# Altium footprint library 7-Connectors-11.PcbLib: 59 footprints (part 1 of 4) (continued)
## HFBR-2602Z [mm] "HFBR-2602Z Series, Fiber Optic Receiver, Through Hole Mount" (continued)
3D body "HFBR-2602Z.stp": height 10.2, standoff -3.6, extent -5.08,-6.348 17.62,6.348

## HFBR-X40X [mm] "HFBR-0400Z Series, Fiber Optic Transmitter or Receiver, Through Hole Mount"
height 10.2
pads (8):
  round 1.7 hole 1: 1(-1.27,3.81) 4(-1.27,-3.81) 5(1.27,-3.81) 8(1.27,3.81)
  round 1.4 hole 0.7: 2(-1.27,1.27) 3(-1.27,-1.27) 6(1.27,-1.27) 7(1.27,1.27)
Top Overlay:
  circle w0.3: c-3.81,5.08 r0.15
  lines w0.2: 7.62,-3.2 8.12,-3.2 8.12,3.2 7.62,3.2 ; 8.12,2.7 8.62,3.2 ; 8.62,-3.2 9.12,2.7 ; 8.62,-3.2 8.12,-2.7 8.62,3.2 ; 8.62,-3.2 9.12,-2.7 ; 8.62,3.2 9.12,2.7 ; 9.12,-2.7 9.62,3.2 ; 9.12,-2.7 9.62,-3.2 ; 9.12,2.7 9.62,3.2 ; 9.62,-3.2 10.12,2.7 ; 9.62,-3.2 10.12,-2.7 ; 9.62,3.2 10.12,2.7 ; 10.12,-2.7 10.62,3.2 ; 10.12,-2.7 10.62,-3.2 ; 10.12,2.7 10.62,3.2 ; 10.62,-3.2 11.12,2.7 ; 10.62,-3.2 11.12,-2.7 ; 10.62,3.2 11.12,2.7 ; 11.12,-2.7 11.62,3.2 ; 11.12,-2.7 11.62,-3.2 ; 11.12,2.7 11.62,3.2 ; 11.62,-3.2 12.12,2.7 ; 11.62,-3.2 12.12,-2.7 ; 11.62,3.2 12.12,2.7 ; 12.12,-2.7 12.62,3.2 ; 12.12,-2.7 12.62,-3.2 ; 12.12,2.7 12.62,3.2 ; 12.62,-3.2 13.12,2.7 ; 12.62,-3.2 13.12,-2.7 ; 12.62,3.2 13.12,2.7 ; 13.12,-2.7 13.62,3.2 ; 13.12,-2.7 13.62,-3.2 ; 13.12,2.7 13.62,3.2 ; 13.62,-3.2 14.12,2.7 ; 13.62,-3.2 14.12,-2.7 ; 13.62,3.2 14.12,2.7 ; 14.12,-2.7 14.62,3.2 ; 14.12,-2.7 14.62,-3.2 ; 14.12,2.7 14.62,3.2 ; 14.62,-3.2 15.12,2.7 ; 14.62,-3.2 15.12,-2.7 ; 14.62,3.2 15.12,2.7 ; 15.12,-2.7 15.62,3.2 ; 15.12,-2.7 15.62,-3.2 ; 15.12,2.7 15.62,3.2 ; 15.62,-3.2 16.12,2.7 ; 15.62,-3.2 16.12,-2.7 ; 15.62,3.2 16.12,2.7 ; 16.12,-2.7 16.62,3.2 ; 16.12,-2.7 16.62,-3.2 ; 16.12,2.7 16.62,3.2 ; 16.62,-3.2 17.12,2.7 ; 16.62,-3.2 17.12,-2.7 17.12,2.7 ; 16.62,3.2 17.12,2.7 ; -5.08,-6.15 ccw(c-4.88,-6.15) -4.88,-6.35 7.42,-6.35 ccw(c7.42,-6.15) 7.62,-6.15 7.62,6.15 ccw(c7.42,6.15) 7.42,6.35 -4.88,6.35 ccw(c-4.88,6.15) -5.08,6.15 -5.08,-6.15
Mechanical 8:
  lines w0.1: -2.27,-3.81 -1.27,-3.81 ; -2.27,-1.27 -1.27,-1.27 ; -2.27,1.27 -1.27,1.27 ; -2.27,3.81 -1.27,3.81 ; -1.27,-4.81 -1.27,-3.81 ; -1.27,-2.81 -1.27,-3.81 ; -1.27,-2.27 -1.27,-1.27 ; -1.27,-0.27 -1.27,-1.27 ; -1.27,0.27 -1.27,1.27 ; -1.27,2.27 -1.27,1.27 ; -1.27,2.81 -1.27,3.81 ; -1.27,4.81 -1.27,3.81 ; -1,0 0,0 ; -0.27,-3.81 -1.27,-3.81 ; -0.27,-1.27 -1.27,-1.27 ; -0.27,1.27 -1.27,1.27 ; -0.27,3.81 -1.27,3.81 ; 0,-1 0,0 ; 0,1 0,0 ; 0.27,-3.81 1.27,-3.81 ; 0.27,-1.27 1.27,-1.27 ; 0.27,1.27 1.27,1.27 ; 0.27,3.81 1.27,3.81 ; 1,0 0,0 ; 1.27,-4.81 1.27,-3.81 ; 1.27,-2.81 1.27,-3.81 ; 1.27,-2.27 1.27,-1.27 ; 1.27,-0.27 1.27,-1.27 ; 1.27,0.27 1.27,1.27 ; 1.27,2.27 1.27,1.27 ; 1.27,2.81 1.27,3.81 ; 1.27,4.81 1.27,3.81 ; 2.27,-3.81 1.27,-3.81 ; 2.27,-1.27 1.27,-1.27 ; 2.27,1.27 1.27,1.27 ; 2.27,3.81 1.27,3.81
Mechanical 14:
  circle w0.3: c-3.81,5.08 r0.15
  lines w0.1: 7.62,-3.2 8.12,-3.2 8.12,3.2 7.62,3.2 ; 8.12,2.7 8.62,3.2 ; 8.62,-3.2 9.12,2.7 ; 8.62,-3.2 8.12,-2.7 8.62,3.2 ; 8.62,-3.2 9.12,-2.7 ; 8.62,3.2 9.12,2.7 ; 9.12,-2.7 9.62,3.2 ; 9.12,-2.7 9.62,-3.2 ; 9.12,2.7 9.62,3.2 ; 9.62,-3.2 10.12,2.7 ; 9.62,-3.2 10.12,-2.7 ; 9.62,3.2 10.12,2.7 ; 10.12,-2.7 10.62,3.2 ; 10.12,-2.7 10.62,-3.2 ; 10.12,2.7 10.62,3.2 ; 10.62,-3.2 11.12,2.7 ; 10.62,-3.2 11.12,-2.7 ; 10.62,3.2 11.12,2.7 ; 11.12,-2.7 11.62,3.2 ; 11.12,-2.7 11.62,-3.2 ; 11.12,2.7 11.62,3.2 ; 11.62,-3.2 12.12,2.7 ; 11.62,-3.2 12.12,-2.7 ; 11.62,3.2 12.12,2.7 ; 12.12,-2.7 12.62,3.2 ; 12.12,-2.7 12.62,-3.2 ; 12.12,2.7 12.62,3.2 ; 12.62,-3.2 13.12,2.7 ; 12.62,-3.2 13.12,-2.7 ; 12.62,3.2 13.12,2.7 ; 13.12,-2.7 13.62,3.2 ; 13.12,-2.7 13.62,-3.2 ; 13.12,2.7 13.62,3.2 ; 13.62,-3.2 14.12,2.7 ; 13.62,-3.2 14.12,-2.7 ; 13.62,3.2 14.12,2.7 ; 14.12,-2.7 14.62,3.2 ; 14.12,-2.7 14.62,-3.2 ; 14.12,2.7 14.62,3.2 ; 14.62,-3.2 15.12,2.7 ; 14.62,-3.2 15.12,-2.7 ; 14.62,3.2 15.12,2.7 ; 15.12,-2.7 15.62,3.2 ; 15.12,-2.7 15.62,-3.2 ; 15.12,2.7 15.62,3.2 ; 15.62,-3.2 16.12,2.7 ; 15.62,-3.2 16.12,-2.7 ; 15.62,3.2 16.12,2.7 ; 16.12,-2.7 16.62,3.2 ; 16.12,-2.7 16.62,-3.2 ; 16.12,2.7 16.62,3.2 ; 16.62,-3.2 17.12,2.7 ; 16.62,-3.2 17.12,-2.7 17.12,2.7 ; 16.62,3.2 17.12,2.7 ; -5.08,-6.15 ccw(c-4.88,-6.15) -4.88,-6.35 7.42,-6.35 ccw(c7.42,-6.15) 7.62,-6.15 7.62,6.15 ccw(c7.42,6.15) 7.42,6.35 -4.88,6.35 ccw(c-4.88,6.15) -5.08,6.15 -5.08,-6.15
3D body "HFBR-x40x.stp": height 10.2, standoff -3.6, extent -5.08,-6.35 17.62,6.35

## HFBR-X41XTZ [mm] "HFBR-14xxZ, HFBR-14xxZ Series With Threaded ST Port, Fiber Optic Transmitter or Receiver, Through Hole Mount"
height 10.2
pads (8):
  round 1.6 hole 0.9: 1(-1.27,3.81) 4(-1.27,-3.81) 5(1.27,-3.81) 8(1.27,3.81)
  round 1.4 hole 0.7: 2(-1.27,1.27) 3(-1.27,-1.27) 6(1.27,-1.27) 7(1.27,1.27)
Top Overlay:
  circle w0.3: c-3.81,5.08 r0.15
  lines w0.2: 7.62,-4.25 8.12,-4.75 ; 7.62,4.25 8.12,4.75 ; 12.72,-3.525 22.12,-3.525 22.12,3.525 12.72,3.525 ; 16.92,-3.525 16.92,-4.2 18.32,-4.2 18.32,-3.525 ; 16.92,3.525 16.92,4.2 18.32,4.2 18.32,3.525 ; 22.12,-0.6 15.92,-0.6 cw(c15.92,0) 15.92,0.6 22.12,0.6 ; 8.12,-4.75 8.12,4.75 ; 8.12,-4.75 8.62,-4.25 ; 8.12,4.75 8.62,4.25 ; 8.62,-4.25 8.62,4.25 ; 8.62,-4.25 9.12,-4.75 ; 8.62,4.25 9.12,4.75 ; 9.12,-4.75 9.12,4.75 ; 9.12,-4.75 9.62,-4.25 ; 9.12,4.75 9.62,4.25 ; 9.62,-4.25 9.62,4.25 ; 9.62,-4.25 10.12,-4.75 ; 9.62,4.25 10.12,4.75 ; 10.12,-4.75 10.12,4.75 ; 10.12,-4.75 10.62,-4.25 ; 10.12,4.75 10.62,4.25 ; 10.62,-4.25 10.62,4.25 ; 10.62,-4.25 11.12,-4.75 ; 10.62,4.25 11.12,4.75 ; 11.12,-4.75 11.12,4.75 ; 11.12,-4.75 11.62,-4.25 ; 11.12,4.75 11.62,4.25 ; 11.62,-4.25 11.62,4.25 ; 11.62,-4.25 12.12,-4.75 ; 11.62,4.25 12.12,4.75 ; 12.12,-4.75 12.12,4.75 ; 12.12,-4.75 12.72,-4.15 12.72,4.15 12.12,4.75 ; -5.08,-6.15 ccw(c-4.88,-6.15) -4.88,-6.35 7.42,-6.35 ccw(c7.42,-6.15) 7.62,-6.15 7.62,6.15 ccw(c7.42,6.15) 7.42,6.35 -4.88,6.35 ccw(c-4.88,6.15) -5.08,6.15 -5.08,-6.15
Mechanical 8:
  lines w0.1: -2.27,-3.81 -1.27,-3.81 ; -2.27,-1.27 -1.27,-1.27 ; -2.27,1.27 -1.27,1.27 ; -2.27,3.81 -1.27,3.81 ; -1.27,-4.81 -1.27,-3.81 ; -1.27,-2.81 -1.27,-3.81 ; -1.27,-2.27 -1.27,-1.27 ; -1.27,-0.27 -1.27,-1.27 ; -1.27,0.27 -1.27,1.27 ; -1.27,2.27 -1.27,1.27 ; -1.27,2.81 -1.27,3.81 ; -1.27,4.81 -1.27,3.81 ; -1,0 0,0 ; -0.27,-3.81 -1.27,-3.81 ; -0.27,-1.27 -1.27,-1.27 ; -0.27,1.27 -1.27,1.27 ; -0.27,3.81 -1.27,3.81 ; 0,-1 0,0 ; 0,1 0,0 ; 0.27,-3.81 1.27,-3.81 ; 0.27,-1.27 1.27,-1.27 ; 0.27,1.27 1.27,1.27 ; 0.27,3.81 1.27,3.81 ; 1,0 0,0 ; 1.27,-4.81 1.27,-3.81 ; 1.27,-2.81 1.27,-3.81 ; 1.27,-2.27 1.27,-1.27 ; 1.27,-0.27 1.27,-1.27 ; 1.27,0.27 1.27,1.27 ; 1.27,2.27 1.27,1.27 ; 1.27,2.81 1.27,3.81 ; 1.27,4.81 1.27,3.81 ; 2.27,-3.81 1.27,-3.81 ; 2.27,-1.27 1.27,-1.27 ; 2.27,1.27 1.27,1.27 ; 2.27,3.81 1.27,3.81
Mechanical 14:
  circle w0.3: c-3.81,5.08 r0.15
  lines w0.1: 7.62,-4.25 8.12,-4.75 ; 7.62,4.25 8.12,4.75 ; 12.72,-3.525 22.12,-3.525 22.12,3.525 12.72,3.525 ; 16.92,-3.525 16.92,-4.2 18.32,-4.2 18.32,-3.525 ; 16.92,3.525 16.92,4.2 18.32,4.2 18.32,3.525 ; 22.12,-0.6 15.92,-0.6 cw(c15.92,0) 15.92,0.6 22.12,0.6 ; 8.12,-4.75 8.12,4.75 ; 8.12,-4.75 8.62,-4.25 ; 8.12,4.75 8.62,4.25 ; 8.62,-4.25 8.62,4.25 ; 8.62,-4.25 9.12,-4.75 ; 8.62,4.25 9.12,4.75 ; 9.12,-4.75 9.12,4.75 ; 9.12,-4.75 9.62,-4.25 ; 9.12,4.75 9.62,4.25 ; 9.62,-4.25 9.62,4.25 ; 9.62,-4.25 10.12,-4.75 ; 9.62,4.25 10.12,4.75 ; 10.12,-4.75 10.12,4.75 ; 10.12,-4.75 10.62,-4.25 ; 10.12,4.75 10.62,4.25 ; 10.62,-4.25 10.62,4.25 ; 10.62,-4.25 11.12,-4.75 ; 10.62,4.25 11.12,4.75 ; 11.12,-4.75 11.12,4.75 ; 11.12,-4.75 11.62,-4.25 ; 11.12,4.75 11.62,4.25 ; 11.62,-4.25 11.62,4.25 ; 11.62,-4.25 12.12,-4.75 ; 11.62,4.25 12.12,4.75 ; 12.12,-4.75 12.12,4.75 ; 12.12,-4.75 12.72,-4.15 12.72,4.15 12.12,4.75 ; -5.08,-6.15 ccw(c-4.88,-6.15) -4.88,-6.35 7.42,-6.35 ccw(c7.42,-6.15) 7.62,-6.15 7.62,6.15 ccw(c7.42,6.15) 7.42,6.35 -4.88,6.35 ccw(c-4.88,6.15) -5.08,6.15 -5.08,-6.15
3D body "HFBR-x41xTZ.stp": height 10.2, standoff -3.6, extent -5.08,-6.35 22.12,6.35

## HFBR-X52X [mm] "HFBR-0500Z Series, Fiber Optic Transmitter or Receiver, Through Hole Mount"
height 7.62
pads (6):
  round 1.7 hole 1: 1(-3.81,3.81) 2(-3.81,1.27) 3(-3.81,-1.27) 4(-3.81,-3.81) 5(3.81,3.81) 8(3.81,-3.81)
Top Overlay:
  circle w0.2: c11.62,-2.6 r0.6
  circle w0.2: c11.62,2.6 r0.6
  circle w0.3: c-6.65,3.2 r0.15
  lines w0.2: -6.58,-5.08 1.12,-5.08 1.12,-3.05 2.72,-3.05 2.72,-4.25 1.92,-4.065 1.92,-5.08 5.72,-5.08 11.067,-2.833 cw(c11.62,-2.6) 11.311,-2.086 7.554,-3.129 cw(c7.42,-2.647) 6.923,-2.7 6.923,2.7 cw(c7.42,2.647) 7.554,3.129 11.311,2.086 cw(c11.62,2.6) 11.067,2.833 5.72,5.08 1.92,5.08 1.92,6.095 2.72,5.91 2.72,7.11 1.12,7.11 1.12,5.08 -6.58,5.08 -6.58,3.88 -5.98,3.88 -5.98,0.6 -6.58,0.6 -6.58,-0.6 -5.98,-0.6 -5.98,-3.88 -6.58,-3.88 -6.58,-5.08
Mechanical 8:
  lines w0.1: -4.31,-3.81 -3.81,-3.81 ; -4.31,-1.27 -3.81,-1.27 ; -4.31,1.27 -3.81,1.27 ; -4.31,3.81 -3.81,3.81 ; -3.81,-4.31 -3.81,-3.81 ; -3.81,-3.31 -3.81,-3.81 ; -3.81,-1.77 -3.81,-1.27 ; -3.81,-0.77 -3.81,-1.27 ; -3.81,0.77 -3.81,1.27 ; -3.81,1.77 -3.81,1.27 ; -3.81,3.31 -3.81,3.81 ; -3.81,4.31 -3.81,3.81 ; -3.31,-3.81 -3.81,-3.81 ; -3.31,-1.27 -3.81,-1.27 ; -3.31,1.27 -3.81,1.27 ; -3.31,3.81 -3.81,3.81 ; -0.5,0 0,0 ; 0,-0.5 0,0 ; 0,0.5 0,0 ; 0.5,0 0,0 ; 3.31,-3.81 3.81,-3.81 ; 3.31,3.81 3.81,3.81 ; 3.81,-4.31 3.81,-3.81 ; 3.81,-3.31 3.81,-3.81 ; 3.81,3.31 3.81,3.81 ; 3.81,4.31 3.81,3.81 ; 4.31,-3.81 3.81,-3.81 ; 4.31,3.81 3.81,3.81
Mechanical 14:
  circle w0.1: c11.62,2.6 r0.6
  circle w0.1: c11.62,-2.6 r0.6
  circle w0.3: c-6.65,3.2 r0.15
  lines w0.1: -6.58,-5.08 -6.58,-3.88 -5.98,-3.88 -5.98,-0.6 -6.58,-0.6 -6.58,0.6 -5.98,0.6 -5.98,3.88 -6.58,3.88 -6.58,5.08 1.12,5.08 1.12,7.11 2.72,7.11 2.72,5.91 1.92,6.095 1.92,5.08 5.72,5.08 11.067,2.833 ccw(c11.62,2.6) 11.311,2.086 7.554,3.129 ccw(c7.42,2.647) 6.923,2.7 6.923,-2.7 ccw(c7.42,-2.647) 7.554,-3.129 11.311,-2.086 ccw(c11.62,-2.6) 11.067,-2.833 5.72,-5.08 1.92,-5.08 1.92,-4.065 2.72,-4.25 2.72,-3.05 1.12,-3.05 1.12,-5.08 -6.58,-5.08 ; 3.11,-3.81 ccw(c3.81,-3.81) 4.51,-3.81 4.51,3.81 ccw(c3.81,3.81) 3.11,3.81 3.11,-3.81
3D body "HFBR-x52x.stp": height 7.66, standoff -4, extent -6.58,-5.08 12.22,7.11

## HFBR-X53X [mm] "HFBR-0500Z Series, Vertical Package Fiber Optic Transmitter or Receiver, Through Hole Mount"
height 18.8
pads (7):
  round 1.7 hole 1: 1(-3.81,3.81) 2(-3.81,1.27) 3(-3.81,-1.27) 4(-3.81,-3.81) 5(3.81,-3.81) 8(3.81,3.81)
  round 4.6 hole 2.3: MTG1(0,0)
Top Overlay:
  circle w0.2: c-8.24,0 r1.9
  lines w0.2: -11.73,-3.88 -12.75,-3.88 -12.75,-5.08 -11.73,-5.08 ; -11.73,-3.2 -4.901,-3.2 ; -11.73,-2 -4.825,-2 ; -11.73,2 -4.825,2 ; -11.73,3.2 -4.901,3.2 ; -11.73,3.88 -12.75,3.88 -12.75,5.08 5.54,5.08 5.54,-5.08 -11.73,-5.08 ; -4.75,-5.08 -4.75,-4.634 ; -4.75,-0.446 -4.75,0.446 ; -4.75,4.634 -4.75,7.11 -11.73,7.11 -11.73,-5.08 ; -3.276,-2.4 -1.27,-2.4 ; -3.276,2.4 -1.27,2.4 ; 1.484,-2.4 3.49,-2.4 ; 1.484,2.4 3.49,2.4 ; 3.49,-2.602 3.49,2.602 ; 4.13,-2.602 4.13,2.602
Mechanical 8:
  lines w0.1: -4.31,-3.81 -3.81,-3.81 ; -4.31,-1.27 -3.81,-1.27 ; -4.31,1.27 -3.81,1.27 ; -4.31,3.81 -3.81,3.81 ; -3.81,-4.31 -3.81,-3.81 ; -3.81,-3.31 -3.81,-3.81 ; -3.81,-1.77 -3.81,-1.27 ; -3.81,-0.77 -3.81,-1.27 ; -3.81,0.77 -3.81,1.27 ; -3.81,1.77 -3.81,1.27 ; -3.81,3.31 -3.81,3.81 ; -3.81,4.31 -3.81,3.81 ; -3.31,-3.81 -3.81,-3.81 ; -3.31,-1.27 -3.81,-1.27 ; -3.31,1.27 -3.81,1.27 ; -3.31,3.81 -3.81,3.81 ; -0.5,0 0,0 ; 0,-0.5 0,0 ; 0,0.5 0,0 ; 0.5,0 0,0 ; 3.31,-3.81 3.81,-3.81 ; 3.31,3.81 3.81,3.81 ; 3.81,-4.31 3.81,-3.81 ; 3.81,-3.31 3.81,-3.81 ; 3.81,3.31 3.81,3.81 ; 3.81,4.31 3.81,3.81 ; 4.31,-3.81 3.81,-3.81 ; 4.31,3.81 3.81,3.81
Mechanical 14:
  circle w0.1: c-8.24,0 r1.9
  lines w0.1: -11.73,-3.88 -12.75,-3.88 -12.75,-5.08 -11.73,-5.08 ; -11.73,-3.2 -4.11,-3.2 -4.11,-2 -11.73,-2 ; -11.73,2 -4.11,2 -4.11,3.2 -11.73,3.2 ; -11.73,3.88 -12.75,3.88 -12.75,5.08 5.54,5.08 5.54,-5.08 -11.73,-5.08 ; -4.75,-5.08 -4.75,-3.2 ; -4.75,-2 -4.75,2 ; -4.75,-1.6 3.49,-1.6 ; -4.75,1.6 3.49,1.6 ; -4.75,3.2 -4.75,7.11 -11.73,7.11 -11.73,-5.08 ; -4.11,-2.4 3.49,-2.4 ; -4.11,2.4 3.49,2.4 ; 3.11,3.81 cw(c3.81,3.81) 4.51,3.81 ; 3.49,-3.81 ccw(c3.81,-3.81) 4.13,-3.81 4.13,3.81 ccw(c3.81,3.81) 3.49,3.81 3.49,-3.81
3D body "HFBR-x53x.stp": height 18.8, standoff -4, extent -12.75,-5.08 5.54,7.11

## HFBR-X119TZ [mm] "HFBR-2119TZ And HFBR-1119TZ, Fiber Optic Transmitter or Receiver, Through Hole Mount"
height 9.8
pads (16):
  round 1.5 hole 0.8: 1(-8.89,-3.81) 2(-6.35,-3.81) 3(-3.81,-3.81) 4(-1.27,-3.81) 5(1.27,-3.81) 6(3.81,-3.81) 7(6.35,-3.81) 8(8.89,-3.81) 9(8.89,3.81) 10(6.35,3.81) 11(3.81,3.81) 12(1.27,3.81) 13(-1.27,3.81) 14(-3.81,3.81) 15(-6.35,3.81) 16(-8.89,3.81)
Top Overlay:
  lines w0.2: 11.34,-3.8 11.74,3.8 ; 11.34,3.5 11.74,3.8 ; 11.356,-3.5 11.74,-3.8 ; 23.49,-3.5 23.49,-4.1 24.79,-4.1 24.79,-3.5 ; 23.49,3.5 23.49,4.1 24.79,4.1 24.79,3.5 ; 28.64,-0.6 22.74,-0.6 cw(c22.74,0) 22.74,0.6 28.64,0.6 ; 11.74,-3.8 12.124,3.5 ; 11.74,-3.8 12.156,-3.5 ; 11.74,3.8 12.124,3.5 ; 12.124,3.5 12.54,3.8 ; 12.156,-3.5 12.54,3.8 ; 12.156,-3.5 12.54,-3.8 ; 12.54,-3.8 12.924,3.5 ; 12.54,-3.8 12.956,-3.5 ; 12.54,3.8 12.924,3.5 ; 12.924,3.5 13.34,3.8 ; 12.956,-3.5 13.34,3.8 ; 12.956,-3.5 13.34,-3.8 ; 13.34,-3.8 13.724,3.5 ; 13.34,-3.8 13.756,-3.5 ; 13.34,3.8 13.724,3.5 ; 13.724,3.5 14.14,3.8 ; 13.756,-3.5 14.14,3.8 ; 13.756,-3.5 14.14,-3.8 ; 14.14,-3.8 14.524,3.5 ; 14.14,-3.8 14.556,-3.5 ; 14.14,3.8 14.524,3.5 ; 14.524,3.5 14.94,3.8 ; 14.556,-3.5 14.94,3.8 ; 14.556,-3.5 14.94,-3.8 ; 14.94,-3.8 15.324,3.5 ; 14.94,-3.8 15.356,-3.5 ; 14.94,3.8 15.324,3.5 ; 15.324,3.5 15.74,3.8 ; 15.356,-3.5 15.74,3.8 ; 15.356,-3.5 15.74,-3.8 16.14,-3.5 ; 15.74,3.8 16.14,3.5 ; 16.14,-3.5 28.64,-3.5 28.64,3.5 16.14,3.5 ; 16.14,-3.5 16.14,3.5 ; -12.06,-6.095 11.34,-6.095 11.34,6.095 -12.06,6.095 -12.06,-6.095
Mechanical 8:
  lines w0.1: -9.39,-3.81 -8.89,-3.81 ; -9.39,3.81 -8.89,3.81 ; -8.89,-4.31 -8.89,-3.81 ; -8.89,-3.31 -8.89,-3.81 ; -8.89,3.31 -8.89,3.81 ; -8.89,4.31 -8.89,3.81 ; -8.39,-3.81 -8.89,-3.81 ; -8.39,3.81 -8.89,3.81 ; -6.85,-3.81 -6.35,-3.81 ; -6.85,3.81 -6.35,3.81 ; -6.35,-4.31 -6.35,-3.81 ; -6.35,-3.31 -6.35,-3.81 ; -6.35,3.31 -6.35,3.81 ; -6.35,4.31 -6.35,3.81 ; -5.85,-3.81 -6.35,-3.81 ; -5.85,3.81 -6.35,3.81 ; -4.31,-3.81 -3.81,-3.81 ; -4.31,3.81 -3.81,3.81 ; -3.81,-4.31 -3.81,-3.81 ; -3.81,-3.31 -3.81,-3.81 ; -3.81,3.31 -3.81,3.81 ; -3.81,4.31 -3.81,3.81 ; -3.31,-3.81 -3.81,-3.81 ; -3.31,3.81 -3.81,3.81 ; -1.77,-3.81 -1.27,-3.81 ; -1.77,3.81 -1.27,3.81 ; -1.27,-4.31 -1.27,-3.81 ; -1.27,-3.31 -1.27,-3.81 ; -1.27,3.31 -1.27,3.81 ; -1.27,4.31 -1.27,3.81 ; -0.77,-3.81 -1.27,-3.81 ; -0.77,3.81 -1.27,3.81 ; -0.5,0 0,0 ; 0,-0.5 0,0 ; 0,0.5 0,0 ; 0.5,0 0,0 ; 0.77,-3.81 1.27,-3.81 ; 0.77,3.81 1.27,3.81 ; 1.27,-4.31 1.27,-3.81 ; 1.27,-3.31 1.27,-3.81 ; 1.27,3.31 1.27,3.81 ; 1.27,4.31 1.27,3.81 ; 1.77,-3.81 1.27,-3.81 ; 1.77,3.81 1.27,3.81 ; 3.31,-3.81 3.81,-3.81 ; 3.31,3.81 3.81,3.81 ; 3.81,-4.31 3.81,-3.81 ; 3.81,-3.31 3.81,-3.81 ; 3.81,3.31 3.81,3.81 ; 3.81,4.31 3.81,3.81 ; 4.31,-3.81 3.81,-3.81 ; 4.31,3.81 3.81,3.81 ; 5.85,-3.81 6.35,-3.81 ; 5.85,3.81 6.35,3.81 ; 6.35,-4.31 6.35,-3.81 ; 6.35,-3.31 6.35,-3.81 ; 6.35,3.31 6.35,3.81 ; 6.35,4.31 6.35,3.81 ; 6.85,-3.81 6.35,-3.81 ; 6.85,3.81 6.35,3.81 ; 8.39,-3.81 8.89,-3.81 ; 8.39,3.81 8.89,3.81 ; 8.89,-4.31 8.89,-3.81 ; 8.89,-3.31 8.89,-3.81 ; 8.89,3.31 8.89,3.81 ; 8.89,4.31 8.89,3.81 ; 9.39,-3.81 8.89,-3.81 ; 9.39,3.81 8.89,3.81
Mechanical 14:
  lines w0.1: 11.34,-3.8 11.74,3.8 ; 11.34,3.5 11.74,3.8 ; 11.356,-3.5 11.74,-3.8 ; 23.49,-3.5 23.49,-4.1 24.79,-4.1 24.79,-3.5 ; 23.49,3.5 23.49,4.1 24.79,4.1 24.79,3.5 ; 28.64,-0.6 22.74,-0.6 cw(c22.74,0) 22.74,0.6 28.64,0.6 ; 11.74,-3.8 12.124,3.5 ; 11.74,-3.8 12.156,-3.5 ; 11.74,3.8 12.124,3.5 ; 12.124,3.5 12.54,3.8 ; 12.156,-3.5 12.54,3.8 ; 12.156,-3.5 12.54,-3.8 ; 12.54,-3.8 12.924,3.5 ; 12.54,-3.8 12.956,-3.5 ; 12.54,3.8 12.924,3.5 ; 12.924,3.5 13.34,3.8 ; 12.956,-3.5 13.34,3.8 ; 12.956,-3.5 13.34,-3.8 ; 13.34,-3.8 13.724,3.5 ; 13.34,-3.8 13.756,-3.5 ; 13.34,3.8 13.724,3.5 ; 13.724,3.5 14.14,3.8 ; 13.756,-3.5 14.14,3.8 ; 13.756,-3.5 14.14,-3.8 ; 14.14,-3.8 14.524,3.5 ; 14.14,-3.8 14.556,-3.5 ; 14.14,3.8 14.524,3.5 ; 14.524,3.5 14.94,3.8 ; 14.556,-3.5 14.94,3.8 ; 14.556,-3.5 14.94,-3.8 ; 14.94,-3.8 15.324,3.5 ; 14.94,-3.8 15.356,-3.5 ; 14.94,3.8 15.324,3.5 ; 15.324,3.5 15.74,3.8 ; 15.356,-3.5 15.74,3.8 ; 15.356,-3.5 15.74,-3.8 16.14,-3.5 ; 15.74,3.8 16.14,3.5 ; 16.14,-3.5 28.64,-3.5 28.64,3.5 16.14,3.5 ; 16.14,-3.5 16.14,3.5 ; -12.06,-6.095 11.34,-6.095 11.34,6.095 -12.06,6.095 -12.06,-6.095
3D body "HFBR-x119TZ.stp": height 9.8, standoff -3.2, extent -12.06,-6.095 28.64,6.095

## KMSD18 [mm]
height 6.5
pads (13):
  rect 2x1.2 smd: 1(0,-1.016) 3(0,-6.579) 4(0,-8.204) 5(0,-11.252) 6(0,-12.979) 7(0,-15.57) 8(0,-17.501) 9(0,1.651) 10(0,-20.98)
  rect 2x1.1 smd: 2(0,-3.226) CD(0,-4.75)
  rect 2.2x1.2 smd: #(22.768,-21.399) #(22.895,7.15)
Top Overlay:
  lines w0.127: 1.102,-21.425 1.102,7.15 30.058,7.15 30.058,3.823 cw(c29.121,3.796) 29.148,2.86 ccw(c30.058,-7.099) 29.118,-17.055 cw(c29.079,-18.033) 30.058,-18.072 30.058,-21.425 1.102,-21.425
Mechanical 1:
  circle w0.127: c24.8,-19.724 r0.8
  circle w0.127: c24.8,4.576 r0.8
Mechanical 15:
  lines w0.254: -1.337,-22.187 -1.337,8.039 30.058,8.039 30.058,-22.187 -1.337,-22.187
3D body "tf-28x29.stp": height 2.68, standoff -0.01, extent 0.075,-21.412 29.851,7.188
3D body "arm-tf.stp": height 0, standoff 0, extent -1,1.051 1,2.251
3D body "arm-tf.stp": height 0, standoff 0, extent -0.974,-1.616 1.026,-0.416
3D body "arm-tf.stp": height 0, standoff 0, extent -1.025,-3.826 0.975,-2.626
3D body "arm-tf.stp": height 0, standoff 0, extent -0.949,-5.401 1.051,-4.201
3D body "arm-tf.stp": height 0, standoff 0, extent -0.949,-7.153 1.051,-5.953
3D body "arm-tf.stp": height 0, standoff 0, extent -0.974,-8.804 1.026,-7.604
3D body "arm-tf.stp": height 0, standoff 0, extent -0.949,-11.852 1.051,-10.652
3D body "arm-tf.stp": height 0, standoff 0, extent -0.924,-13.579 1.076,-12.379
3D body "arm-tf.stp": height 0, standoff 0, extent -0.924,-16.196 1.076,-14.996
3D body "arm-tf.stp": height 0, standoff 0, extent -0.949,-18.101 1.051,-16.901
3D body "arm-tf.stp": height 0, standoff 0, extent -1,-21.58 1,-20.38
3D body "arm-tf.stp": height 0, standoff 0, extent 21.768,-21.999 23.768,-20.799
3D body "arm-tf.stp": height 0, standoff 0, extent 21.895,6.55 23.895,7.75

## LEMO_ECG.0B.302.CLV [mm] "Size 0B, 2 Female Contacts Elbow Receptacle (90? With Two Nut For Panel Mounting"
height 15.5
pads (2):
  round 1.6 hole 0.9: 1(-1.27,0) 2(1.27,0)
Top Overlay:
  lines w0.2: -1.27,-1.2 ccw(c-1.27,0) -1.27,1.2 ; 0,0 0.125,0 ; 1.923,-2.303 cw(c0,0) 2.985,0.3 ; 2.432,-0.3 3.57,-0.3 ; 2.432,0.3 3.57,0.3 ; 6.77,-2.36 3.57,-2.36 3.57,2.36 6.77,2.36 ; 18.77,-4.1 10.22,-4.1 10.07,-3.95 ; 18.77,-0.75 21.27,-0.75 ; 18.77,0.75 21.27,0.75 ; 18.77,4.1 10.22,4.1 10.07,3.95 ; 20.12,-0.75 20.12,-5.953 ; 20.12,0.75 20.12,5.953 ; 7.07,-3.95 6.77,-3.65 6.77,3.65 7.07,3.95 ; 7.07,-3.95 10.07,-3.95 ; 7.07,-3.95 7.07,3.95 ; 7.07,3.95 10.07,3.95 ; 10.07,-3.95 10.07,3.95 ; 20.12,-5.953 21.27,-5.283 21.27,5.283 20.12,5.953 ; 20.12,-5.953 18.77,-5.953 18.77,5.953 20.12,5.953
  text "1" at -0.4,1.425 h1
  text "2" at 2.352,-1.842 h1
Mechanical 8:
  lines w0.1: -1.77,0 -1.27,0 ; -1.27,-0.5 -1.27,0 ; -1.27,0.5 -1.27,0 ; -0.77,0 -1.27,0 ; -0.354,-0.354 0,0 ; -0.354,0.354 0,0 ; 0.354,-0.354 0,0 ; 0.354,0.354 0,0 ; 0.77,0 1.27,0 ; 1.27,-0.5 1.27,0 ; 1.27,0.5 1.27,0 ; 1.77,0 1.27,0
Mechanical 14:
  circle w0.1: c1.27,1.27 r0.498
  circle w0.1: c1.27,-1.27 r0.498
  lines w0.1: -1.27,-1.2 ccw(c-1.27,0) -1.27,1.2 ; -0.583,-0.3 cw(c-1.27,0) -0.583,0.3 ; 0,0 0.125,0 ; 0.872,-0.3 ccw(c1.27,0) 1.668,-0.3 ; 0.872,0.3 cw(c1.27,0) 1.668,0.3 ; 1.923,-2.303 cw(c0,0) 2.985,0.3 ; 3.57,-0.3 -1.27,-0.3 cw(c-1.27,0) -1.27,0.3 3.57,0.3 ; 6.77,-2.36 3.57,-2.36 3.57,2.36 6.77,2.36 ; 18.77,-4.1 10.22,-4.1 10.07,-3.95 ; 18.77,-0.75 21.27,-0.75 ; 18.77,0.75 21.27,0.75 ; 18.77,4.1 10.22,4.1 10.07,3.95 ; 20.12,-0.75 20.12,-5.953 ; 20.12,0.75 20.12,5.953 ; 7.07,-3.95 6.77,-3.65 6.77,3.65 7.07,3.95 ; 7.07,-3.95 10.07,-3.95 ; 7.07,-3.95 7.07,3.95 ; 7.07,3.95 10.07,3.95 ; 10.07,-3.95 10.07,3.95 ; 20.12,-5.953 21.27,-5.283 21.27,5.283 20.12,5.953 ; 20.12,-5.953 18.77,-5.953 18.77,5.953 20.12,5.953
  text "1" at -0.4,1.425 h1
  text "2" at 2.352,-1.842 h1
3D body "LEMO_ECG.0B.302.CLV_Part1.stp": height 10.75, standoff -3.7, extent -1.57,-4.1 21.27,4.1
3D body "LEMO_ECG.0B.302.CLV_Part2.stp": height 12.2, standoff 0.3, extent 18.77,-5.953 21.27,5.953
3D body "LEMO_ECG.0B.302.CLV_Part3.stp": height 12.5, standoff 0, extent 15.27,-6.25 16.27,6.25
3D body "LEMO_ECG.0B.302.CLV_Part4.stp": height 12.45, standoff 0.05, extent 13.265,-5.5 15.265,5.5
3D body "LEMO_ECG.0B.302.CLV_Part5.stp": height 2.3, standoff 0, extent -3,-3 3,3
3D body "LEMO_ECG.0B.302.CLV_Part6.stp": height -3.7, standoff -8.7, extent -1.57,-0.3 1.57,0.3
3D body "LEMO_ECG.0B.302.CLV_Part7.stp": height -8.7, standoff -13.7, extent -1.57,-0.3 1.57,0.3
3D body "LEMO_ECG.0B.302.CLV_Part8.stp": height -8.7, standoff -13.7, extent -1.57,-0.3 1.57,0.3
3D body "LEMO_ECG.0B.302.CLV_Part9.stp": height -13.7, standoff -18.7, extent -1.57,-0.3 1.57,0.3
3D body "LEMO_ECG.0B.302.CLV_Part10.stp": height -18.7, standoff -23.7, extent -1.57,-0.3 1.57,0.3
3D body "LEMO_ECG.0B.302.CLV_Part11.stp": height -23.7, standoff -28.7, extent -1.57,-0.3 1.57,0.3
3D body "LEMO_ECG.0B.302.CLV_Part12.stp": height -28.7, standoff -33.7, extent -1.57,-0.3 1.57,0.3
3D body "LEMO_ECG.0B.302.CLV_Part13.stp": height -33.7, standoff -38.7, extent -1.57,-0.3 1.57,0.3